# Altium footprint library Inductors&Transformers.PcbLib: 69 footprints (part 1 of 5)
Each footprint in its own frame and in the unit in brackets; x right, y up, seen from the top. Pads: shape width x height; smd on the part's side, far side on the other; paste and mask are expansions set on the pad; w line width, h text height; cw(c..) or ccw(c..) is an arc to the next point about the centre after c.
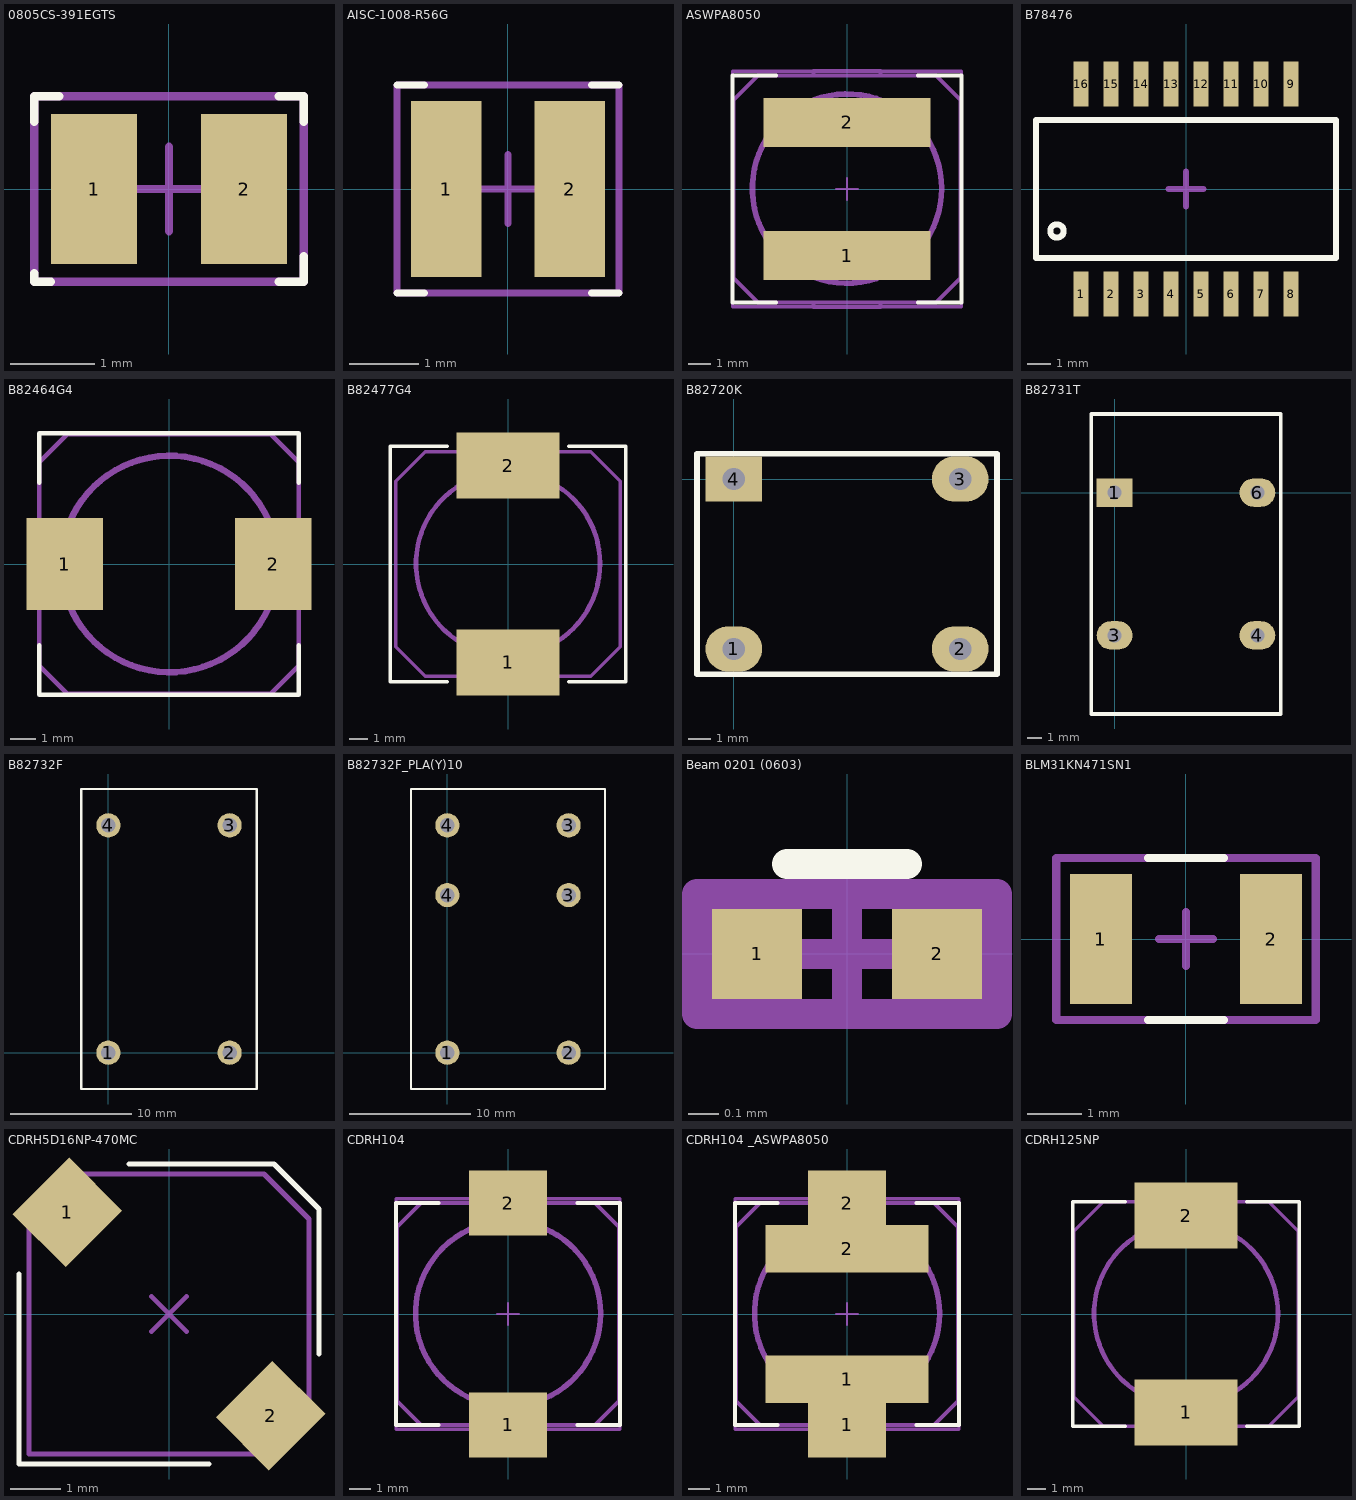
[diagram p0: the footprints below, top view; thin cyan lines are the x and y axes]

## 0805CS-391EGTS [mm]
pads (2):
  rect 1.02x1.78 smd mask+0.05: 1(-0.89,0) 2(0.89,0)
Top Overlay:
  lines w0.1: -1.6,-1 -1.6,-1.1 -1.4,-1.1 ; -1.6,0.8 -1.6,1.1 -1.3,1.1 ; 1.3,-1.1 1.6,-1.1 1.6,-0.8 ; 1.3,1.1 1.6,1.1 1.6,0.8
Mechanical 15:
  lines w0.1: -0.5,0 0.5,0 ; 0,-0.5 0,0.5 ; -1.6,-1.1 -1.6,1.1 1.6,1.1 1.6,-1.1 -1.6,-1.1
3D body "Coilcraft-0805CS.step": height 1.51, standoff -0.01, extent -1.145,-0.863 1.145,0.863

## AISC-1008-R56G [mm]
pads (2):
  rect 1.02x2.54 smd mask+0.05: 1(-0.89,0) 2(0.89,0)
Top Overlay:
  lines w0.1: -1.6,-1.5 -1.2,-1.5 ; -1.6,1.5 -1.2,1.5 ; 1.2,-1.5 1.6,-1.5 ; 1.2,1.5 1.6,1.5
Mechanical 15:
  lines w0.1: -0.5,0 0.5,0 ; 0,-0.5 0,0.5 ; -1.6,-1.5 -1.6,1.5 1.6,1.5 1.6,-1.5 -1.6,-1.5
3D body "inductor_1008as-056j-yy.stp": height 2.02, standoff 0, extent -1.45,-1.4 1.45,1.4

## ASWPA8050 [mm] "Inductor SMD 8x8 mm."
height 5
pads (2):
  rect 7.5x2.2 smd: 1(0,-3) 2(0,3)
Top Overlay:
  lines w0.178: -3.2,-5.1 -5.15,-5.1 -5.15,5.1 -3.2,5.1 ; 3.2,-5.1 5.15,-5.1 5.15,5.1 3.2,5.1
Mechanical 13:
  circle w0.254: c0,0.02 r4.258
  lines w0.178: -1.5,-5.1 -1.5,-5.3 1.5,-5.3 1.5,-5.1 ; -1.5,5.1 -1.5,5.3 1.5,5.3 1.5,5.1 ; -5.1,-4 -5.1,4 -4,5.1 4,5.1 5.1,4 5.1,-4 4,-5.1 -4,-5.1 -5.1,-4
Mechanical 15:
  lines w0.1: -0.5,0 0.5,0 ; 0,-0.5 0,0.5
  lines w0.15: -5.15,-5.3 5.15,-5.3 5.15,5.3 -5.15,5.3 -5.15,-5.3
3D body "User Library-FPI0705 (7_8 x 7_0 x 5_0).step": height 5, standoff 0, extent -3.5,-3.9 3.5,3.9

## B78476 [mm] "10/100 Base-T magnetics module"
height 5.6
pads (16):
  rect 0.64x1.905 smd: 1(-4.445,-4.445) 2(-3.175,-4.445) 3(-1.905,-4.445) 4(-0.635,-4.445) 5(0.635,-4.445) 6(1.905,-4.445) 7(3.175,-4.445) 8(4.445,-4.445) 9(4.445,4.445) 10(3.175,4.445) 11(1.905,4.445) 12(0.635,4.445) 13(-0.635,4.445) 14(-1.905,4.445) 15(-3.175,4.445) 16(-4.445,4.445)
Top Overlay:
  circle w0.254: c-5.461,-1.778 r0.284
  lines w0.254: -6.35,-2.921 6.35,-2.921 6.35,2.921 -6.35,2.921 -6.35,-2.921
Mechanical 15:
  lines w0.254: -0.75,0 0.75,0 ; 0,-0.75 0,0.75
3D body "User Library-b78476a8247a003.step": height 5.6, standoff 0, extent -6.35,-4.701 6.35,4.699

## B82464G4 [mm] "SMT Power Inductor"
height 4.8
pads (2):
  rect 3x3.6 smd: 1(-4.1,0) 2(4.1,0)
Top Overlay:
  lines w0.178: -5.1,-3.2 -5.1,-5.15 5.1,-5.15 5.1,-3.2 ; -5.1,3.2 -5.1,5.15 5.1,5.15 5.1,3.2
Mechanical 13:
  circle w0.254: c0.02,0 r4.258
  lines w0.178: -5.1,-1.5 -5.3,-1.5 -5.3,1.5 -5.1,1.5 ; 5.1,-1.5 5.3,-1.5 5.3,1.5 5.1,1.5 ; -5.1,-4 -4,-5.1 4,-5.1 5.1,-4 5.1,4 4,5.1 -4,5.1 -5.1,4 -5.1,-4
3D body "User Library-B82464G4.step": height 4.81, standoff 0, extent -5.2,-5.2 5.2,5.2

## B82477G4 [mm]
height 8
pads (2):
  rect 5.6x3.6 smd: 1(0,-5.35) 2(0,5.35)
Top Overlay:
  lines w0.178: -3.3,-6.4 -6.4,-6.4 -6.4,6.4 -3.3,6.4 ; 3.3,-6.4 6.4,-6.4 6.4,6.4 3.3,6.4
Mechanical 13:
  circle w0.254: c0,0.02 r5
  lines w0.178: -2.5,-6.1 -2.5,-6.4 2.5,-6.4 2.5,-6.1 ; -2.5,6.1 -2.5,6.4 2.5,6.4 2.5,6.1 ; -6.1,-4.5 -6.1,4.5 -4.5,6.1 4.5,6.1 6.1,4.5 6.1,-4.5 4.5,-6.1 -4.5,-6.1 -6.1,-4.5
3D body "User Library-Inductor-b82477g4.step": height 8.1, standoff 0.1, extent -6.4,-6.4 6.4,6.4

## B82720K [mil]
height 555
pads (4):
  oval 100x80 hole 39.37: 1(0,-300) 2(400,-300) 3(400,0)
  rect 100x80 hole 39.37: 4(0,0)
Top Overlay:
  lines w10: -65,-345 -65,45 465,45 465,-345 -65,-345

## B82731T [mil] "AL line filter inductor"
height 846
pads (4):
  rect 100x80 hole 39.37: 1(0,0)
  oval 100x80 hole 39.37: 3(0,-400) 4(400,-400) 6(400,0)
Top Overlay:
  lines w10: -65,-620 -65,220 465,220 465,-620 -65,-620
3D body "User Library-B82731T2801A020.step": height 803.54, standoff -137.8, extent -66.07,-592.51 461.74,194.89

## B82732F [mm]
height 13.5
pads (4):
  round 2 hole 1.2: 1(0,0) 2(10,0) 3(10,18.75) 4(0,18.75)
Top Overlay:
  lines w0.2: -2.25,-3 -2.25,21.75 12.25,21.75 12.25,-3 -2.25,-3
3D body "Triad Magnetics-CMF16-273900.step": height 14.7, standoff -2.3, extent -2.25,-2.625 12.25,21.375

## B82732F_PLA(Y)10 [mm]
height 13.513
pads (6):
  round 2 hole 1.2: 1(0,0) 2(10,0) 3(10,13) 3(10,18.75) 4(0,13) 4(0,18.75)
Top Overlay:
  lines w0.2: -3,-3 13,-3 13,21.75 -3,21.75 -3,-3
3D body "Triad Magnetics-CMF16-273900.step": height 14.7, standoff -2.3, extent -2.25,-2.625 12.25,21.375

## Beam 0201 (0603) [mm] "Ferrite Beam"
pads (2):
  rect 0.3x0.3 smd: 1(-0.3,0) 2(0.3,0)
Top Overlay:
  lines w0.1: -0.2,0.3 0.2,0.3
Mechanical 15:
  lines w0.1: -0.2,0 0.2,0 ; 0,-0.2 0,0.2 ; 0,0.2 0.5,0.2 0.5,-0.2 -0.5,-0.2 -0.5,0.2 0,0.2
3D body "742692003.stp": height 0.29, standoff -0.01, extent -0.3,-0.15 0.3,0.15

## BLM31KN471SN1 [mm]
pads (2):
  rect 1.15x2.4 smd: 1(-1.575,0) 2(1.575,0)
Top Overlay:
  lines w0.15: -0.7,-1.5 0.7,-1.5 ; -0.7,1.5 0.7,1.5
Mechanical 15:
  lines w0.15: -0.5,0 0.5,0 ; 0,-0.5 0,0.5 ; -2.4,-1.5 2.4,-1.5 2.4,1.5 -2.4,1.5 -2.4,-1.5
3D body "User Library-BLM31PG330SN1.step": height 1.11, standoff -0.01, extent -1.6,-0.81 1.6,0.81

## CDRH5D16NP-470MC [mm]
height 1.8
pads (2):
  rect 1.5x1.6 smd rot 135: 1(-2.033,2.033) 2(2.033,-2.033)
Top Overlay:
  lines w0.1: -3,0.8 -3,-3 0.8,-3 ; -0.8,3 2.1,3 3,2.1 3,-0.8
Mechanical 13:
  lines w0.1: -0.354,-0.354 0.354,0.354 ; -0.354,0.354 0.354,-0.354 ; -2.8,-2.8 1.745,-2.8 2.8,-1.745 2.8,1.9 1.9,2.8 -2,2.8 -2.8,2 -2.8,-2.8
3D body "User Library-CDRH5D18.STEP": height 2, standoff 0, extent -3.005,-3 3,3

## CDRH104 [mm] "Inductor SMD 10x10 mm."
height 4
pads (2):
  rect 3.6x3 smd: 1(0,-5.1) 2(0,5.1)
Top Overlay:
  lines w0.178: -3.2,-5.1 -5.15,-5.1 -5.15,5.1 -3.2,5.1 ; 3.2,-5.1 5.15,-5.1 5.15,5.1 3.2,5.1
Mechanical 13:
  circle w0.254: c0,0.02 r4.258
  lines w0.178: -1.5,-5.1 -1.5,-5.3 1.5,-5.3 1.5,-5.1 ; -1.5,5.1 -1.5,5.3 1.5,5.3 1.5,5.1 ; -5.1,-4 -5.1,4 -4,5.1 4,5.1 5.1,4 5.1,-4 4,-5.1 -4,-5.1 -5.1,-4
Mechanical 15:
  lines w0.1: -0.5,0 0.5,0 ; 0,-0.5 0,0.5
  lines w0.15: -5.15,-5.3 5.15,-5.3 5.15,5.3 -5.15,5.3 -5.15,-5.3
3D body "User Library-cdrh104r.STEP": height 4, standoff 0, extent -5.125,-5.25 5.175,5.25

## CDRH104 _ASWPA8050 [mm] "Inductor SMD 10x10 mm."
height 4
pads (4):
  rect 3.6x3 smd: 1(0,-5.1) 2(0,5.1)
  rect 7.5x2.2 smd: 1(0,-3) 2(0,3)
Top Overlay:
  lines w0.178: -3.2,-5.1 -5.15,-5.1 -5.15,5.1 -3.2,5.1 ; 3.2,-5.1 5.15,-5.1 5.15,5.1 3.2,5.1
Mechanical 13:
  circle w0.254: c0,0.02 r4.258
  lines w0.178: -1.5,-5.1 -1.5,-5.3 1.5,-5.3 1.5,-5.1 ; -1.5,5.1 -1.5,5.3 1.5,5.3 1.5,5.1 ; -5.1,-4 -4,-5.1 4,-5.1 5.1,-4 5.1,4 4,5.1 -4,5.1 -5.1,4 -5.1,-4
Mechanical 15:
  lines w0.1: -0.5,0 0.5,0 ; 0,-0.5 0,0.5
  lines w0.15: -5.15,-5.3 -5.15,5.3 5.15,5.3 5.15,-5.3 -5.15,-5.3
3D body "User Library-cdrh104r.STEP": height 4, standoff 0, extent -5.125,-5.25 5.175,5.25

## CDRH125NP [mm]
height 6
pads (2):
  rect 5.6x3.6 smd: 1(0,-5.35) 2(0,5.35)
Top Overlay:
  lines w0.178: -3.3,-6.1 -6.15,-6.1 -6.15,6.1 -3.3,6.1 ; 3.3,-6.1 6.15,-6.1 6.15,6.1 3.3,6.1
Mechanical 13:
  circle w0.254: c0,0.02 r5
  lines w0.178: -2.5,-6.1 -2.5,-6.4 2.5,-6.4 2.5,-6.1 ; -2.5,6.1 -2.5,6.4 2.5,6.4 2.5,6.1 ; -6.1,-4.5 -4.5,-6.1 4.5,-6.1 6.1,-4.5 6.1,4.5 4.5,6.1 -4.5,6.1 -6.1,4.5 -6.1,-4.5
3D body "SUMIDA-CDRH125_LD.step": height 6.3, standoff 0.05, extent -6,-6.151 6,6.191